# Altium footprint library ST封装.PcbLib: 1336 footprints (part 53 of 109)
Each footprint in its own frame and in the unit in brackets; x right, y up, seen from the top. Pads: shape width x height; smd on the part's side, far side on the other; paste and mask are expansions set on the pad; w line width, h text height; cw(c..) or ccw(c..) is an arc to the next point about the centre after c.
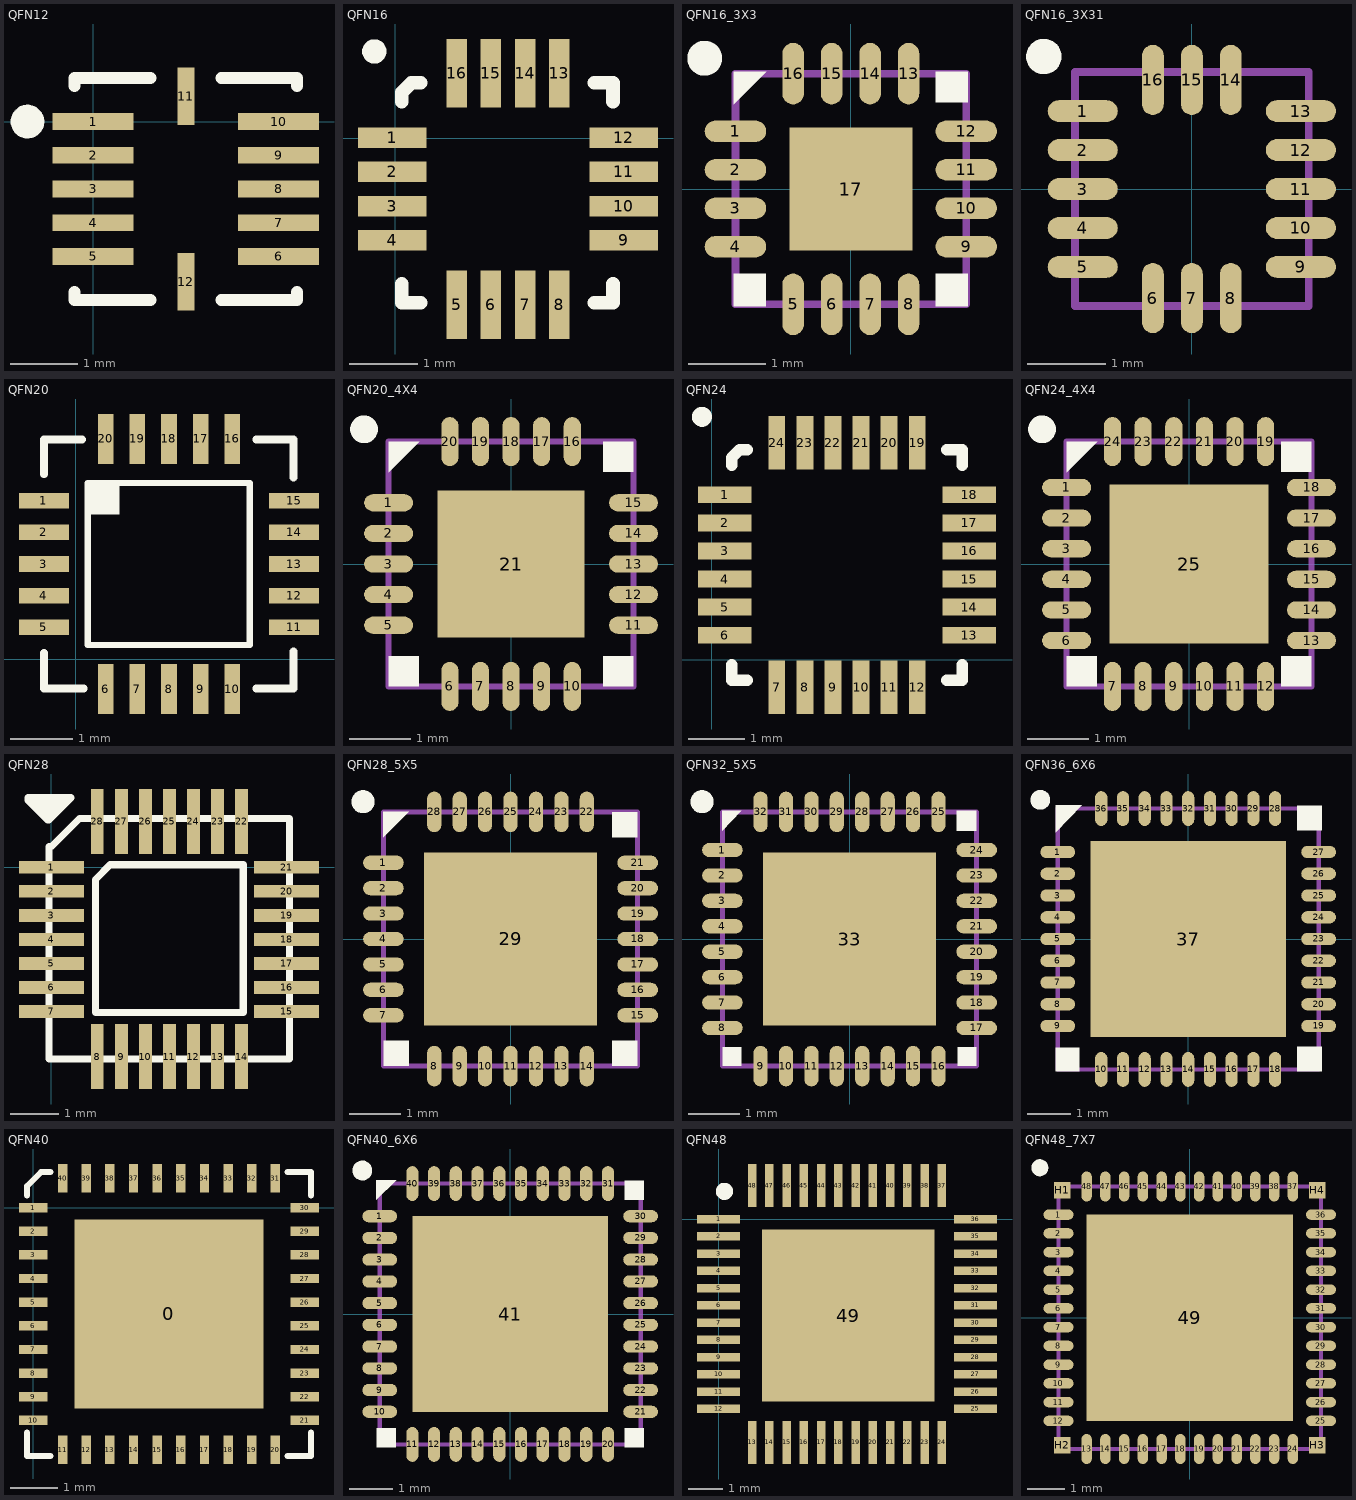
[diagram p52: the footprints below, top view; thin cyan lines are the x and y axes]

## QFN12 [mm]
pads (12):
  rect 1.2x0.25 smd: 1(0,0) 2(0,-0.5) 3(0,-1) 4(0,-1.5) 5(0,-2) 6(2.75,-2) 7(2.75,-1.5) 8(2.75,-1) 9(2.75,-0.5) 10(2.75,0)
  rect 0.25x0.85 smd: 11(1.375,0.375) 12(1.375,-2.375)
Top Overlay:
  circle w0.25: c-0.975,0 r0.125
  lines w0.178: -0.275,-2.525 -0.275,-2.65 0.85,-2.65 ; -0.275,0.525 -0.275,0.65 0.85,0.65 ; 1.9,-2.65 3.025,-2.65 3.025,-2.525 ; 1.9,0.65 3.025,0.65 3.025,0.525

## QFN16 [mm]
height 1.75
pads (16):
  rect 1x0.3 smd: 1(-0.042,0.011) 2(-0.042,-0.489) 3(-0.042,-0.989) 4(-0.042,-1.489) 9(3.34,-1.489) 10(3.34,-0.989) 11(3.34,-0.489) 12(3.34,0.011)
  rect 0.3x1 smd: 5(0.899,-2.43) 6(1.399,-2.43) 7(1.899,-2.43) 8(2.399,-2.43) 13(2.399,0.952) 14(1.899,0.952) 15(1.399,0.952) 16(0.899,0.952)
Top Overlay:
  circle w0.254: c-0.304,1.27 r0.05
  lines w0.2: 0.099,-2.125 0.099,-2.4 0.374,-2.4 ; 0.099,0.536 0.099,0.674 0.236,0.811 0.374,0.811 ; 2.908,-2.4 3.183,-2.4 3.183,-2.125 ; 2.908,0.811 3.183,0.811 3.183,0.536
3D body "QFN16 3x3.STEP": height 0.9, standoff 0, extent 0.102,-2.283 3.144,0.759

## QFN16_3X3 [mm]
pads (17):
  oval 0.8x0.28 smd: 1(-1.5,0.75) 2(-1.5,0.25) 3(-1.5,-0.25) 4(-1.5,-0.75) 9(1.5,-0.75) 10(1.5,-0.25) 11(1.5,0.25) 12(1.5,0.75)
  oval 0.28x0.8 smd: 5(-0.75,-1.5) 6(-0.25,-1.5) 7(0.25,-1.5) 8(0.75,-1.5) 13(0.75,1.5) 14(0.25,1.5) 15(-0.25,1.5) 16(-0.75,1.5)
  rect 1.6x1.6 smd: 17(0,0)
Top Overlay:
  circle w0.254: c-1.9,1.7 r0.1
  rectangle: -1.525,-1.525 -1.1,-1.1
  rectangle: 1.1,-1.525 1.525,-1.1
  rectangle: 1.1,1.125 1.525,1.525
  region: -1.525,1.525 -1.1,1.525 -1.525,1.1
Mechanical 15:
  lines w0.1: -1.5,-1.5 -1.5,1.5 1.5,1.5 1.5,-1.5 -1.5,-1.5
3D body "QFN16 3x3.STEP": height 0.9, standoff 0, extent -1.517,-1.525 1.525,1.517

## QFN16_3X31 [mm]
pads (16):
  oval 0.9x0.28 smd: 1(-1.4,1) 2(-1.4,0.5) 3(-1.4,0) 4(-1.4,-0.5) 5(-1.4,-1) 9(1.4,-1) 10(1.4,-0.5) 11(1.4,0) 12(1.4,0.5) 13(1.4,1)
  oval 0.28x0.9 smd: 6(-0.5,-1.4) 7(0,-1.4) 8(0.5,-1.4) 14(0.5,1.4) 15(0,1.4) 16(-0.5,1.4)
Top Overlay:
  circle w0.254: c-1.9,1.7 r0.1
Mechanical 15:
  lines w0.1: -1.5,-1.5 -1.5,1.5 1.5,1.5 1.5,-1.5 -1.5,-1.5
3D body "QFN16 3x3.STEP": height 0.9, standoff 0, extent -1.517,-1.525 1.525,1.517

## QFN20 [mm]
height 1.75
pads (20):
  rect 0.8x0.25 smd: 1(-0.512,2.548) 2(-0.512,2.04) 3(-0.512,1.532) 4(-0.512,1.024) 5(-0.512,0.516) 11(3.502,0.516) 12(3.502,1.024) 13(3.502,1.532) 14(3.502,2.04) 15(3.502,2.548)
  rect 0.25x0.8 smd: 6(0.479,-0.475) 7(0.987,-0.475) 8(1.495,-0.475) 9(2.003,-0.475) 10(2.511,-0.475) 16(2.511,3.539) 17(2.003,3.539) 18(1.495,3.539) 19(0.987,3.539) 20(0.479,3.538)
Top Overlay:
  rectangle: 0.192,2.323 0.7,2.831
  lines w0.1: 0.192,0.231 2.792,0.231 2.792,2.831 0.192,2.831 0.192,0.231
  lines w0.127: -0.508,0.102 -0.508,-0.469 0.127,-0.469 ; -0.508,2.972 -0.508,3.531 0.102,3.531 ; 2.896,-0.469 3.492,-0.469 3.492,0.127 ; 2.896,3.531 3.492,3.531 3.492,2.921
3D body "QFN16 4x4.STEP": height 0.92, standoff 0, extent -0.476,-0.476 3.524,3.524

## QFN20_4X4 [mm]
pads (21):
  oval 0.8x0.28 smd: 1(-2,1) 2(-2,0.5) 3(-2,0) 4(-2,-0.5) 5(-2,-1) 11(2,-1) 12(2,-0.5) 13(2,0) 14(2,0.5) 15(2,1)
  oval 0.28x0.8 smd: 6(-1,-2) 7(-0.5,-2) 8(0,-2) 9(0.5,-2) 10(1,-2) 16(1,2) 17(0.5,2) 18(0,2) 19(-0.5,2) 20(-1,2)
  rect 2.4x2.4 smd: 21(0,0)
Top Overlay:
  circle w0.254: c-2.4,2.2 r0.1
  rectangle: 1.5,1.5 2,2
  rectangle: 1.5,-2 2,-1.5
  rectangle: -2,-2 -1.5,-1.5
  region: -2,2 -1.5,2 -2,1.5
Mechanical 15:
  lines w0.1: -2,-2 -2,2 2,2 2,-2 -2,-2
3D body "QFN20 4X4.step": height 0.92, standoff 0, extent -2,-2 2,2

## QFN24 [mm]
height 1.75
pads (24):
  rect 0.95x0.3 smd: 1(0.228,2.932) 2(0.228,2.432) 3(0.228,1.932) 4(0.228,1.432) 5(0.228,0.932) 6(0.228,0.432) 13(4.578,0.432) 14(4.578,0.932) 15(4.578,1.432) 16(4.578,1.932) 17(4.578,2.432) 18(4.578,2.932)
  rect 0.3x0.95 smd: 7(1.153,-0.493) 8(1.653,-0.493) 9(2.153,-0.493) 10(2.653,-0.493) 11(3.153,-0.493) 12(3.653,-0.493) 19(3.653,3.857) 20(3.153,3.857) 21(2.653,3.857) 22(2.153,3.857) 23(1.653,3.857) 24(1.153,3.857)
Top Overlay:
  circle w0.254: c-0.177,4.318 r0.05
  lines w0.2: 0.353,-0.093 0.353,-0.368 0.628,-0.368 ; 0.353,3.457 0.353,3.595 0.49,3.732 0.628,3.732 ; 4.178,-0.368 4.453,-0.368 4.453,-0.093 ; 4.178,3.732 4.453,3.732 4.453,3.457
3D body "MLF24.STEP": height 1, standoff 0, extent 0.413,-0.254 4.413,3.746

## QFN24_4X4 [mm]
pads (25):
  oval 0.8x0.28 smd: 1(-2,1.25) 2(-2,0.75) 3(-2,0.25) 4(-2,-0.25) 5(-2,-0.75) 6(-2,-1.25) 13(2,-1.25) 14(2,-0.75) 15(2,-0.25) 16(2,0.25) 17(2,0.75) 18(2,1.25)
  oval 0.28x0.8 smd: 7(-1.25,-2) 8(-0.75,-2) 9(-0.25,-2) 10(0.25,-2) 11(0.75,-2) 12(1.25,-2) 19(1.25,2) 20(0.75,2) 21(0.25,2) 22(-0.25,2) 23(-0.75,2) 24(-1.25,2)
  rect 2.6x2.6 smd: 25(0,0)
Top Overlay:
  circle w0.254: c-2.4,2.2 r0.1
  region: -2,-1.5 -2,-2 -1.5,-2 -1.5,-1.5
  region: 1.5,-1.5 1.5,-2 2,-2 2,-1.5
  region: 1.5,2 1.5,1.5 2,1.5 2,2
  region: -1.5,2 -2,2 -2,1.5
Mechanical 15:
  lines w0.1: -2,-2 -2,2 2,2 2,-2 -2,-2
3D body "QFN24 4X4.step": height 0.9, standoff 0, extent -2,-2.002 2.004,2.002

## QFN28 [mm]
pads (28):
  rect 1.35x0.265 smd: 1(0,0) 2(0,-0.5) 3(0,-1) 4(0,-1.5) 5(0,-2) 6(0,-2.5) 7(0,-3) 15(4.893,-3) 16(4.893,-2.5) 17(4.893,-2) 18(4.893,-1.5) 19(4.893,-1) 20(4.893,-0.5) 21(4.893,0)
  rect 0.265x1.35 smd: 8(0.956,-3.938) 9(1.456,-3.938) 10(1.956,-3.938) 11(2.456,-3.938) 12(2.956,-3.938) 13(3.456,-3.938) 14(3.956,-3.938) 22(3.956,0.955) 23(3.456,0.955) 24(2.956,0.955) 25(2.456,0.955) 26(1.956,0.955) 27(1.456,0.955) 28(0.956,0.955)
Top Overlay:
  lines w0.152: -0.483,1.397 -0.076,0.991 -0.051,0.991 0.406,1.448 -0.483,1.448 ; -0.33,1.321 0.203,1.321 ; -0.229,1.194 0.076,1.194 ; -0.102,1.118 0,1.118 ; -0.051,0.432 0,0.432 0.584,1.016 4.954,1.016 4.954,-3.988 -0.05,-3.988 -0.05,0.431 -0.051,0.432 ; 0.915,-3.023 3.989,-3.023 3.989,0.051 1.22,0.051 0.915,-0.254 0.915,-3.023

## QFN28_5X5 [mm]
pads (29):
  oval 0.8x0.28 smd: 1(-2.5,1.5) 2(-2.5,1) 3(-2.5,0.5) 4(-2.5,0) 5(-2.5,-0.5) 6(-2.5,-1) 7(-2.5,-1.5) 15(2.5,-1.5) 16(2.5,-1) 17(2.5,-0.5) 18(2.5,0) 19(2.5,0.5) 20(2.5,1) 21(2.5,1.5)
  oval 0.28x0.8 smd: 8(-1.5,-2.5) 9(-1,-2.5) 10(-0.5,-2.5) 11(0,-2.5) 12(0.5,-2.5) 13(1,-2.5) 14(1.5,-2.5) 22(1.5,2.5) 23(1,2.5) 24(0.5,2.5) 25(0,2.5) 26(-0.5,2.5) 27(-1,2.5) 28(-1.5,2.5)
  rect 3.4x3.4 smd: 29(0,0)
Top Overlay:
  circle w0.254: c-2.9,2.7 r0.1
  rectangle: 2,2 2.5,2.5
  rectangle: -2.5,-2.5 -2,-2
  rectangle: 2,-2.5 2.5,-2
  region: -2.5,2.5 -2.5,2 -2,2.5
Mechanical 15:
  lines w0.1: -2.5,-2.5 2.5,-2.5 2.5,2.5 -2.5,2.5 -2.5,-2.5
3D body "QFN28 5X5.STEP": height 1, standoff 0, extent -2.5,-2.5 2.5,2.5

## QFN32_5X5 [mm]
pads (33):
  oval 0.8x0.28 smd: 1(-2.5,1.75) 2(-2.5,1.25) 3(-2.5,0.75) 4(-2.5,0.25) 5(-2.5,-0.25) 6(-2.5,-0.75) 7(-2.5,-1.25) 8(-2.5,-1.75) 17(2.5,-1.75) 18(2.5,-1.25) 19(2.5,-0.75) 20(2.5,-0.25) 21(2.5,0.25) 22(2.5,0.75) 23(2.5,1.25) 24(2.5,1.75)
  oval 0.28x0.8 smd: 9(-1.75,-2.5) 10(-1.25,-2.5) 11(-0.75,-2.5) 12(-0.25,-2.5) 13(0.25,-2.5) 14(0.75,-2.5) 15(1.25,-2.5) 16(1.75,-2.5) 25(1.75,2.5) 26(1.25,2.5) 27(0.75,2.5) 28(0.25,2.5) 29(-0.25,2.5) 30(-0.75,2.5) 31(-1.25,2.5) 32(-1.75,2.5)
  rect 3.4x3.4 smd: 33(0,0)
Top Overlay:
  circle w0.254: c-2.9,2.7 r0.1
  rectangle: -2.5,-2.5 -2.125,-2.125
  rectangle: 2.125,-2.5 2.5,-2.125
  rectangle: 2.1,2.125 2.5,2.525
  region: -2.5,2.525 -2.125,2.525 -2.5,2.125
Mechanical 15:
  lines w0.1: -2.5,-2.5 2.5,-2.5 2.5,2.5 -2.5,2.5 -2.5,-2.5
3D body "QFN32 5X5.step": height 0.75, standoff 0, extent -2.51,-2.5 2.51,2.52

## QFN36_6X6 [mm]
pads (37):
  oval 0.8x0.28 smd: 1(-3,2) 2(-3,1.5) 3(-3,1) 4(-3,0.5) 5(-3,0) 6(-3,-0.5) 7(-3,-1) 8(-3,-1.5) 9(-3,-2) 19(3,-2) 20(3,-1.5) 21(3,-1) 22(3,-0.5) 23(3,0) 24(3,0.5) 25(3,1) 26(3,1.5) 27(3,2)
  oval 0.28x0.8 smd: 10(-2,-3) 11(-1.5,-3) 12(-1,-3) 13(-0.5,-3) 14(0,-3) 15(0.5,-3) 16(1,-3) 17(1.5,-3) 18(2,-3) 28(2,3) 29(1.5,3) 30(1,3) 31(0.5,3) 32(0,3) 33(-0.5,3) 34(-1,3) 35(-1.5,3) 36(-2,3)
  rect 4.5x4.5 smd: 37(0,0)
Top Overlay:
  circle w0.254: c-3.4,3.2 r0.1
  rectangle: -3.05,-3.05 -2.5,-2.5
  rectangle: 2.5,-3.05 3.075,-2.475
  rectangle: 2.5,2.5 3.075,3.075
  region: -3.05,3.075 -3.05,2.45 -2.45,3.075
Mechanical 15:
  lines w0.1: -3,-3 3,-3 3,3 -3,3 -3,-3
3D body "QFN36 6X6 2.STEP": height 0.8, standoff 0, extent -3.05,-3.05 3.07,3.07

## QFN40 [mm]
pads (41):
  rect 4x4 smd: 0(2.87,-2.25)
  rect 0.6x0.2 smd: 1(0,0) 2(0,-0.5) 3(0,-1) 4(0,-1.5) 5(0,-2) 6(0,-2.5) 7(0,-3) 8(0,-3.5) 9(0,-4) 10(0,-4.5) 21(5.74,-4.5) 22(5.74,-4) 23(5.74,-3.5) 24(5.74,-3) 25(5.74,-2.5) 26(5.74,-2) 27(5.74,-1.5) 28(5.74,-1) 29(5.74,-0.5) 30(5.74,0)
  rect 0.2x0.6 smd: 11(0.62,-5.12) 12(1.12,-5.12) 13(1.62,-5.12) 14(2.12,-5.12) 15(2.62,-5.12) 16(3.12,-5.12) 17(3.62,-5.12) 18(4.12,-5.12) 19(4.62,-5.12) 20(5.12,-5.12) 31(5.12,0.62) 32(4.62,0.62) 33(4.12,0.62) 34(3.62,0.62) 35(3.12,0.62) 36(2.62,0.62) 37(2.12,0.62) 38(1.62,0.62) 39(1.12,0.62) 40(0.62,0.62)
Top Overlay:
  lines w0.127: -0.13,-4.75 -0.13,-5.25 0.37,-5.25 ; -0.13,0.25 -0.13,0.45 0.17,0.75 0.37,0.75 ; 5.37,-5.25 5.87,-5.25 5.87,-4.75 ; 5.37,0.75 5.87,0.75 5.87,0.25
3D body "QFN40 6X6.STEP": height 1.03, standoff -0.02, extent -0.154,-5.388 5.996,0.762

## QFN40_6X6 [mm]
pads (41):
  oval 0.8x0.28 smd: 1(-3,2.25) 2(-3,1.75) 3(-3,1.25) 4(-3,0.75) 5(-3,0.25) 6(-3,-0.25) 7(-3,-0.75) 8(-3,-1.25) 9(-3,-1.75) 10(-3,-2.25) 21(3,-2.25) 22(3,-1.75) 23(3,-1.25) 24(3,-0.75) 25(3,-0.25) 26(3,0.25) 27(3,0.75) 28(3,1.25) 29(3,1.75) 30(3,2.25)
  oval 0.28x0.8 smd: 11(-2.25,-3) 12(-1.75,-3) 13(-1.25,-3) 14(-0.75,-3) 15(-0.25,-3) 16(0.25,-3) 17(0.75,-3) 18(1.25,-3) 19(1.75,-3) 20(2.25,-3) 31(2.25,3) 32(1.75,3) 33(1.25,3) 34(0.75,3) 35(0.25,3) 36(-0.25,3) 37(-0.75,3) 38(-1.25,3) 39(-1.75,3) 40(-2.25,3)
  rect 4.5x4.5 smd: 41(0,0)
Top Overlay:
  circle w0.254: c-3.4,3.3 r0.1
  rectangle: 2.625,2.625 3.075,3.075
  rectangle: 2.625,-3.075 3.075,-2.625
  rectangle: -3.075,-3.075 -2.625,-2.625
  region: -3.075,3.075 -2.625,3.075 -3.075,2.625
Mechanical 15:
  lines w0.1: -3,-3 -3,3 3,3 3,-3 -3,-3
3D body "QFN40 6X6.STEP": height 1.05, standoff 0, extent -3.075,-3.075 3.075,3.075

## QFN48 [mm]
pads (49):
  rect 1.25x0.25 smd: 1(0,0) 2(0,-0.5) 3(0,-1) 4(0,-1.5) 5(0,-2) 6(0,-2.5) 7(0,-3) 8(0,-3.5) 9(0,-4) 10(0,-4.5) 11(0,-5) 12(0,-5.5) 25(7.45,-5.5) 26(7.45,-5) 27(7.45,-4.5) 28(7.45,-4) 29(7.45,-3.5) 30(7.45,-3) 31(7.45,-2.5) 32(7.45,-2) 33(7.45,-1.5) 34(7.45,-1) 35(7.45,-0.5) 36(7.45,0)
  rect 0.25x1.25 smd: 13(0.975,-6.475) 14(1.475,-6.475) 15(1.975,-6.475) 16(2.475,-6.475) 17(2.975,-6.475) 18(3.475,-6.475) 19(3.975,-6.475) 20(4.475,-6.475) 21(4.975,-6.475) 22(5.475,-6.475) 23(5.975,-6.475) 24(6.475,-6.475) 37(6.475,0.975) 38(5.975,0.975) 39(5.475,0.975) 40(4.975,0.975) 41(4.475,0.975) 42(3.975,0.975) 43(3.475,0.975) 44(2.975,0.975) 45(2.475,0.975) 46(1.975,0.975) 47(1.475,0.975) 48(0.975,0.975)
  rect 5x5 smd: 49(3.764,-2.794)
Top Overlay:
  circle w0.25: c0.171,0.806 r0.125
Mechanical 15:
  lines w0.1: 3.225,-2.75 4.225,-2.75 ; 3.725,-3.25 3.725,-2.25
3D body "QFN48 7x7.STEP": height 0.78, standoff -0.02, extent 0.254,-6.304 7.274,0.716

## QFN48_7X7 [mm]
pads (53):
  oval 0.8x0.28 smd: 1(-3.5,2.75) 2(-3.5,2.25) 3(-3.5,1.75) 4(-3.5,1.25) 5(-3.5,0.75) 6(-3.5,0.25) 7(-3.5,-0.25) 8(-3.5,-0.75) 9(-3.5,-1.25) 10(-3.5,-1.75) 11(-3.5,-2.25) 12(-3.5,-2.75) 25(3.5,-2.75) 26(3.5,-2.25) 27(3.5,-1.75) 28(3.5,-1.25) 29(3.5,-0.75) 30(3.5,-0.25) 31(3.5,0.25) 32(3.5,0.75) 33(3.5,1.25) 34(3.5,1.75) 35(3.5,2.25) 36(3.5,2.75)
  oval 0.28x0.8 smd: 13(-2.75,-3.5) 14(-2.25,-3.5) 15(-1.75,-3.5) 16(-1.25,-3.5) 17(-0.75,-3.5) 18(-0.25,-3.5) 19(0.25,-3.5) 20(0.75,-3.5) 21(1.25,-3.5) 22(1.75,-3.5) 23(2.25,-3.5) 24(2.75,-3.5) 37(2.75,3.5) 38(2.25,3.5) 39(1.75,3.5) 40(1.25,3.5) 41(0.75,3.5) 42(0.25,3.5) 43(-0.25,3.5) 44(-0.75,3.5) 45(-1.25,3.5) 46(-1.75,3.5) 47(-2.25,3.5) 48(-2.75,3.5)
  rect 5.5x5.5 smd: 49(0,0)
  rect 0.45x0.45 smd: H1(-3.4,3.4) H2(-3.4,-3.4) H3(3.4,-3.4) H4(3.4,3.4)
Top Overlay:
  circle w0.254: c-4,4 r0.1
Mechanical 15:
  lines w0.1: -3.5,-3.5 -3.5,3.5 3.5,3.5 3.5,-3.5 -3.5,-3.5
3D body "QFN48 7x7.STEP": height 0.78, standoff -0.02, extent -3.52,-3.5 3.5,3.52